# Altium footprint library PcbLib1_newsimcard.PcbLib: 28 footprints (part 1 of 2)
Each footprint in its own frame and in the unit in brackets; x right, y up, seen from the top. Pads: shape width x height; smd on the part's side, far side on the other; paste and mask are expansions set on the pad; w line width, h text height; cw(c..) or ccw(c..) is an arc to the next point about the centre after c.
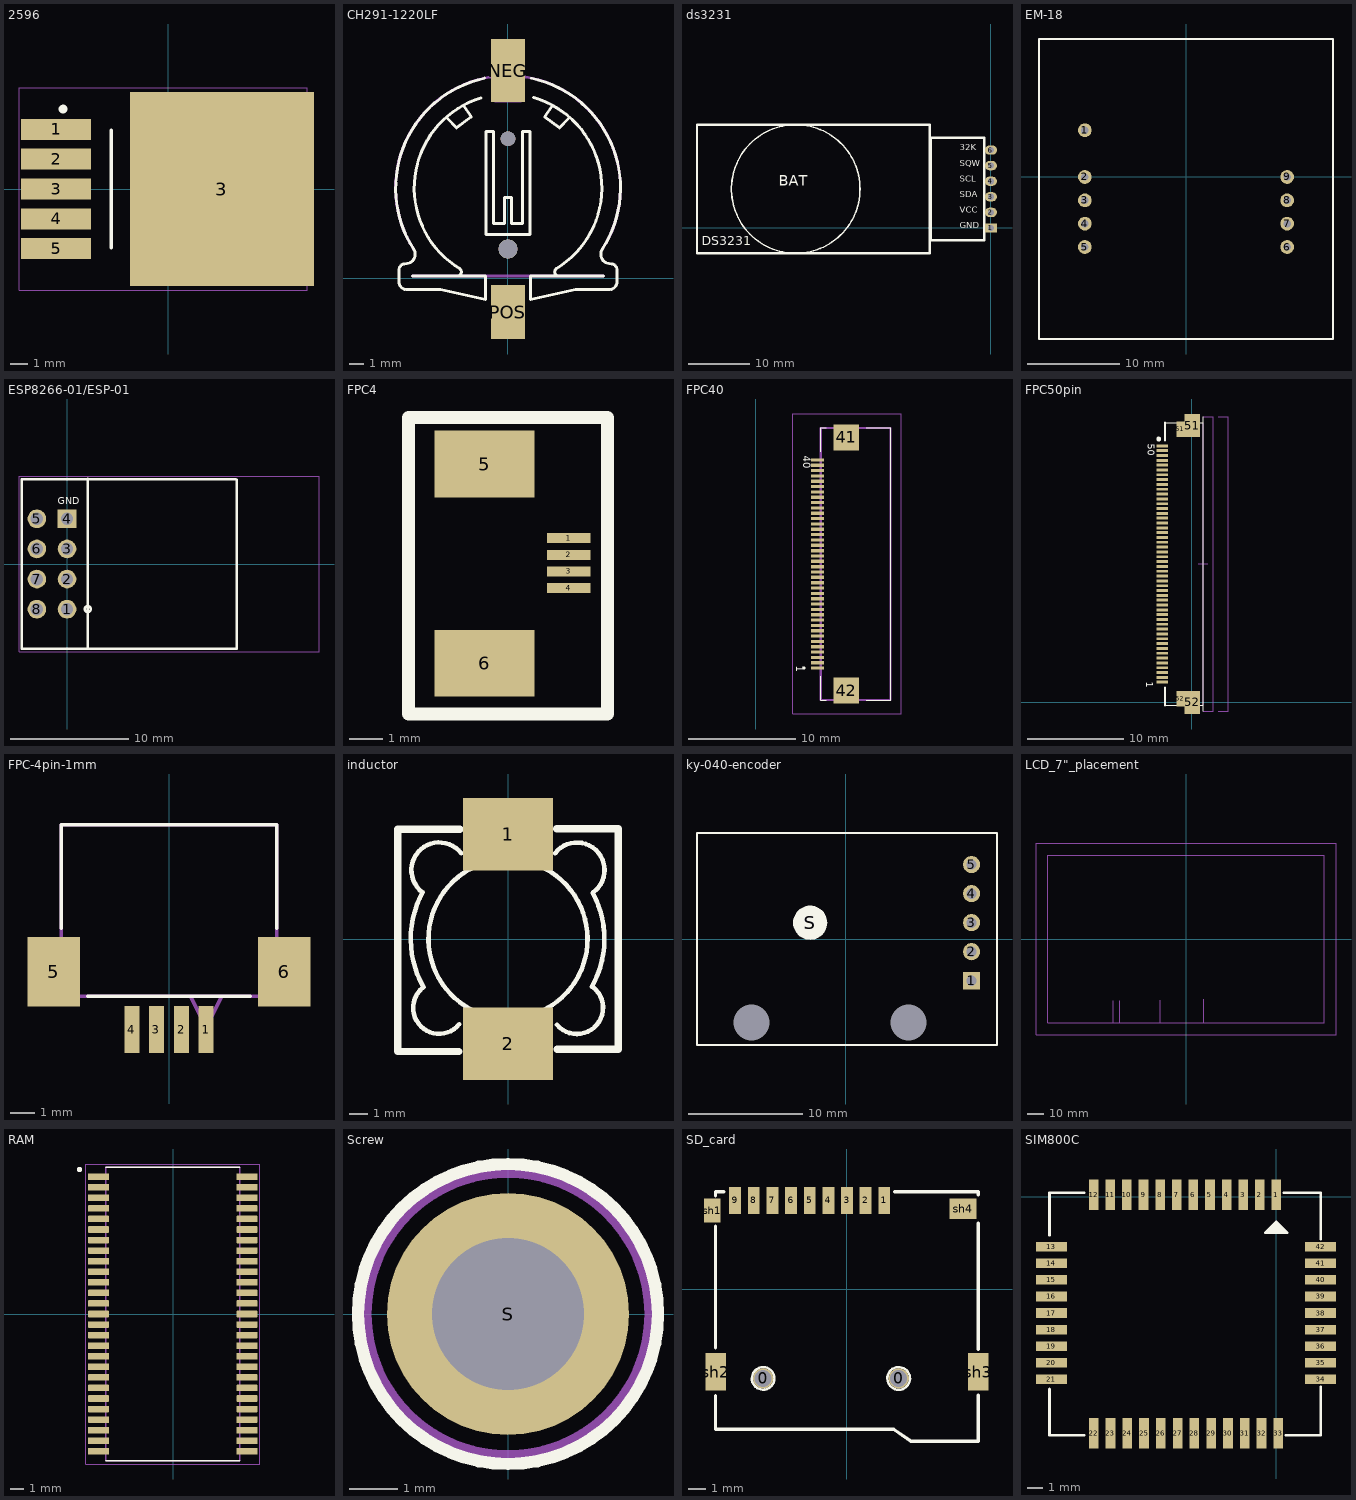
[diagram p0: the footprints below, top view; thin cyan lines are the x and y axes]

## 2596 [mm]
pads (6):
  rect 4x1.2 smd: 1(-6.4,3.4) 2(-6.4,1.7) 3(-6.4,0) 4(-6.4,-1.7) 5(-6.4,-3.4)
  rect 10.5x11.05 smd: 3(3.048,0)
Top Overlay:
  circle w0.25: c-6,4.55 r0.125
  lines w0.2: -3.25,-3.35 -3.25,3.35
Mechanical 13:
  lines w0.1: -2.05,-3.35 -2.05,3.35 4.15,3.35 4.15,-3.35 -2.05,-3.35
Mechanical 15:
  lines w0.05: -8.509,-5.775 -8.509,5.775 7.9,5.775 7.9,-5.775 -8.509,-5.775
  lines w0.1: -0.5,0 0.5,0 ; 0,-0.5 0,0.5
3D body: height 2.38, standoff 0, extent -2.05,-3.35 4.15,3.35

## CH291-1220LF [mm]
pads (4):
  rect 2.3x4.3 smd: NEG(0,14.146)
  rect 2.3x3.66 smd: POS(0,-2.295)
  round 1.3 hole 1.3 unplated: ""(0,2)
  round 1 hole 1 unplated: ""(0,9.5)
Top Overlay:
  lines w0.2: -7.421,0.559 -7.421,-0.239 ccw(c-6.901,-0.239) -6.865,-0.758 ; -7.421,0.561 cw(c-6.993,0.569) -6.985,0.998 ; -6.978,0.997 ccw(c-6.967,1.644) -6.425,1.996 ; -6.863,-0.758 -4.588,-0.758 -1.522,-1.436 -1.522,0.16 -6.5,0.16 ; -6.414,1.979 cw(c0.001,6.145) -1.589,13.627 ; -4.125,10.887 -3.5,10.25 -2.5,11 -3,11.75 ; -3.512,0.162 ccw(c-3.458,0.438) -3.313,0.679 ; -3.274,0.656 cw(c0.029,6.153) -1.846,12.286 ; 1.602,13.624 cw(c0.013,6.151) 6.421,1.99 ; 1.746,12.303 cw(c-0.019,6.148) 3.28,0.659 ; 3,11.75 2.5,11 3.5,10.25 4.125,10.887 ; 3.313,0.679 ccw(c3.457,0.439) 3.501,0.163 ; 6.425,1.996 ccw(c6.967,1.644) 6.978,0.997 ; 6.5,0.16 1.522,0.16 1.522,-1.436 4.588,-0.758 6.863,-0.758 ; 6.865,-0.758 ccw(c6.901,-0.239) 7.421,-0.239 7.421,0.559 ; 6.985,0.998 cw(c6.993,0.569) 7.421,0.561 ; -1.5,3 1.5,3 1.5,10 1,10 1,3.75 0.25,3.75 0.25,5.5 -0.25,5.5 -0.25,3.75 -1,3.75 -1,10 -1.5,10 -1.5,3
Mechanical 13:
  region: 0.9,-3.625 -0.9,-3.625 -0.9,-0.5 0.9,-0.5
  region: 0.9,12 -0.9,12 -0.9,15.825 0.9,15.825
  lines w0.2: -6.5,0.16 6.5,0.16 ; -6.418,1.985 cw(c0,6.153) 6.418,1.985

## ds3231 [mm]
pads (6):
  rect 2x1.5 hole 1: 1(0,0)
  oval 2x1.5 hole 1: 2(0,2.54) 3(0,5.08) 4(0,7.62) 5(0,10.16) 6(0,12.7)
Top Overlay:
  circle w0.254: c-31.877,6.35 r10.5
  lines w0.4: -48,-4.15 -48,16.85 -10,16.85 -10,-4.15 -48,-4.15 ; -9.8,-2 -9.8,14.7 -1.05,14.7 -1.05,-2 -9.8,-2
  text "BAT" at -34.671,6.35 h3
  text "GND" at -5.08,-0.381 h1.7
  text "VCC" at -5.08,2.159 h1.7
  text "SDA" at -5.08,4.699 h1.7
  text "SCL" at -5.08,7.239 h1.7
  text "SQW" at -5.08,9.779 h1.7
  text "32K" at -5.08,12.319 h1.7
  text "DS3231" at -47.244,-3.302 h2.54
3D body "DS3231 RTC (1).SLDPRT": height 14.41, standoff 0.88, extent -47.425,-4.925 -2.675,17.875

## EM-18 [mm]
pads (9):
  round 1.5 hole 0.8 mask+0.05: 1(-11,5.08) 2(-11,0) 3(-11,-2.54) 4(-11,-5.08) 5(-11,-7.62) 6(11,-7.62) 7(11,-5.08) 8(11,-2.54) 9(11,0)
Top Overlay:
  lines w0.2: -16,-17.62 -16,15 16,15 16,-17.62 -16,-17.62

## ESP8266-01/ESP-01 [mm]
pads (8):
  round 1.575 hole 1.05: 1(0,-3.81) 2(0,-1.27) 3(0,1.27) 5(-2.54,3.81) 6(-2.54,1.27) 7(-2.54,-1.27) 8(-2.54,-3.81)
  rect 1.575x1.575 hole 1.05: 4(0,3.81)
Top Overlay:
  circle w0.2: c1.75,-3.8 r0.25
  lines w0.2: 1.75,-7.125 1.75,7.175 ; 14.25,7.15 -3.81,7.15 -3.81,-7.15 14.3,-7.15 ; 14.3,-7.112 14.3,7.112
  text "GND" at -0.762,4.84 h1
Mechanical 15:
  lines w0.05: -4.05,-7.4 -4.05,7.4 21.25,7.4 21.25,-7.4 -4.05,-7.4
3D body "ESP-01S_RevA.STEP": height 10, standoff -1.9, extent -4.025,-7.15 20.575,7.5

## FPC4 [mm]
pads (6):
  rect 1.3x0.3 smd: 1(8.865,26.354) 2(8.865,25.854) 3(8.865,25.354) 4(8.865,24.854)
  rect 3x2 smd: 5(6.35,28.575) 6(6.35,22.606)
Top Overlay:
  lines w0.4: 7.112,29.972 10.033,29.972 10.033,21.082 4.064,21.082 4.064,29.972 7.493,29.972

## FPC40 [mm]
pads (42):
  rect 1.2x0.3 smd: 1(5.771,7.55) 2(5.771,8.05) 3(5.771,8.55) 4(5.771,9.05) 5(5.771,9.55) 6(5.771,10.05) 7(5.771,10.55) 8(5.771,11.05) 9(5.771,11.55) 10(5.771,12.05) 11(5.771,12.55) 12(5.771,13.05) 13(5.771,13.55) 14(5.771,14.05) 15(5.771,14.55) 16(5.771,15.05) 17(5.771,15.55) 18(5.771,16.05) 19(5.771,16.55) 20(5.771,17.05) 21(5.771,17.55) 22(5.771,18.05) 23(5.771,18.55) 24(5.771,19.05) 25(5.771,19.55) 26(5.771,20.05) 27(5.771,20.55) 28(5.771,21.05) 29(5.771,21.55) 30(5.771,22.05) 31(5.771,22.55) 32(5.771,23.05) 33(5.771,23.55) 34(5.771,24.05) 35(5.771,24.55) 36(5.771,25.05) 37(5.771,25.55) 38(5.771,26.05) 39(5.771,26.55) 40(5.771,27.05)
  rect 2.4x2.4 smd: 41(8.471,29.15) 42(8.471,5.45)
Top Overlay:
  lines w0.1: 6.071,4.55 6.596,4.55 6.071,4.55 ; 6.071,4.55 6.071,6.8 6.071,4.55 ; 6.071,30.05 6.071,27.8 6.071,30.05 ; 6.071,30.05 6.596,30.05 6.071,30.05 ; 12.621,4.55 12.621,30.05 ; 12.621,4.55 12.621,30.05 ; 12.621,4.55 10.346,4.55 12.621,4.55 ; 12.621,30.05 10.346,30.05 12.621,30.05
  lines w0.2: 4.446,7.55 cw(c4.496,7.55) 4.546,7.55 ; 4.446,7.55 ccw(c4.496,7.55) 4.546,7.55 ; 4.446,7.55 cw(c4.496,7.55) 4.546,7.55
  text "40" at 4.204,27.432 h1.2
  text "1" at 3.556,7.747 h1.2
Mechanical 13:
  lines w0.2: 6.071,4.55 12.621,4.55 12.621,30.05 6.071,30.05 6.071,4.55
Mechanical 15:
  lines w0.1: 3.446,3.25 13.621,3.25 13.621,31.35 3.446,31.35 3.446,3.25
3D body "54104-4031-TR375.stp": height 2.1, standoff 0, extent 5.201,4.49 12.621,30.11

## FPC50pin [mm]
pads (54):
  rect 1.2x0.3 smd: 1(-3.048,2.098) 2(-3.048,2.598) 3(-3.048,3.098) 4(-3.048,3.598) 5(-3.048,4.098) 6(-3.048,4.598) 7(-3.048,5.098) 8(-3.048,5.598) 9(-3.048,6.098) 10(-3.048,6.598) 11(-3.048,7.098) 12(-3.048,7.598) 13(-3.048,8.098) 14(-3.048,8.598) 15(-3.05,9.098) 16(-3.05,9.598) 17(-3.048,10.098) 18(-3.048,10.598) 19(-3.048,11.098) 20(-3.048,11.598) 21(-3.048,12.098) 22(-3.048,12.598) 23(-3.048,13.098) 24(-3.048,13.598) 25(-3.048,14.098) 26(-3.048,14.598) 27(-3.048,15.098) 28(-3.048,15.598) 29(-3.048,16.098) 30(-3.048,16.598) 31(-3.048,17.098) 32(-3.048,17.598) 33(-3.048,18.098) 34(-3.048,18.598) 35(-3.048,19.098) 36(-3.048,19.598) 37(-3.048,20.098) 38(-3.048,20.598) 39(-3.048,21.098) 40(-3.048,21.598) 41(-3.048,22.098) 42(-3.048,22.598) 43(-3.048,23.098) 44(-3.048,23.598) 45(-3.048,24.098) 46(-3.048,24.598) 47(-3.048,25.098) 48(-3.048,25.598) 49(-3.048,26.098) 50(-3.048,26.598)
  rect 0.8x1.6 smd: 51(-1.148,28.298) 52(-1.148,0.398)
  rect 1.6x2.4 smd: 51(0.052,28.698) 52(0.052,-0.002)
Top Overlay:
  circle w0.25: c-3.398,27.298 r0.125
  lines w0.1: -2.748,-0.302 1.202,-0.302 ; -2.748,28.998 1.202,28.998 ; 1.202,-0.902 1.202,29.598
  lines w0.2: -2.748,-0.302 -2.748,1.548 ; -2.748,27.148 -2.748,28.998
  text "50" at -4.813,26.797 h1.2
  text "1" at -4.953,2.159 h1.2
Bottom Overlay:
  lines w0.2: -2.748,-0.302 -1.948,-0.302 ; -2.748,28.998 -1.948,28.998 ; 1.202,-0.302 1.202,28.998
Bottom Solder:
  lines w0.1: -2.748,-0.302 -2.748,28.998
Mechanical 13:
  lines w0.1: 1.202,-0.902 2.252,-0.902 2.252,29.598 1.202,29.598 ; 1.202,-0.302 1.202,28.998 ; 2.752,-0.902 3.802,-0.902 3.802,29.598 2.752,29.598
Mechanical 15:
  lines w0.1: 0.702,14.348 1.702,14.348 ; 1.202,13.848 1.202,14.848
3D body: height 2, standoff 0, extent -2.747,-0.301 1.201,28.997
3D body: height 2, standoff 0, extent 1.203,-0.901 2.251,29.597

## FPC-4pin-1mm [mil]
pads (6):
  rect 24x75 smd: 1(59,189) 2(20,189) 3(-20,189) 4(-59,189)
  rect 83x110 smd: 5(-183,281) 6(183,281)
Top Overlay:
  lines w6: -171,350 -171,514 171,514 171,350 ; -129,242 129,242
Mechanical 13:
  lines w6: 34,242 59,192 84,242 ; -171,242 171,242 171,514 -171,514 -171,242

## inductor [mm]
pads (2):
  rect 5x4 smd: 1(0,5.8) 2(0,-5.8)
Top Overlay:
  lines w0.254: -4.752,2.599 cw(c-3.81,3.81) -2.595,4.747 ; -4.722,2.582 ccw(c0,0) -4.675,-2.666 ; -4.692,-2.676 ccw(c-3.81,-3.81) -2.688,-4.708 ; -2.463,3.647 ccw(c0,0) -2.422,3.675 ; 2.603,4.749 cw(c3.81,3.81) 4.687,2.557 ; 2.711,-4.752 ccw(c3.81,-3.81) 4.715,-2.679 ; 4.639,-2.636 ccw(c0,0) 4.684,2.555
  lines w0.4: -6.1,6.075 -6.1,-6.225 -2.725,-6.225 ; -6.075,6.075 -2.675,6.075 ; 2.7,6.1 6.1,6.1 6.1,-6.1 2.725,-6.1
3D body "SUMIDA-CDRH127-DEFAULT.STEP": height 7.5, standoff 0.05, extent -6,-6.171 6,6.171

## ky-040-encoder [mm]
pads (8):
  rect 1.5x1.5 hole 0.9: 1(11,-3.65)
  round 1.5 hole 0.9: 2(11,-1.11) 3(11,1.43) 4(11,3.97) 5(11,6.51)
  round 0 hole 3.15: S(-8.25,-7.325) S(5.475,-7.325)
  round 3 on Top Overlay: S(-3.125,1.425)
Top Overlay:
  lines w0.2: -13.025,-9.275 -13.025,9.275 13.225,9.275 13.225,-9.275 -13.025,-9.275
3D body "Encoder KY-040.SLDPRT": height 29.8, standoff 1.99, extent -13.1,-9.3 13.1,9.3

## LCD_7"_placement [mm]
Mechanical 13:
  lines w0.3: -43.5,-50.063 -43.5,-36.788 ; -39.5,-50.063 -39.5,-36.788 ; -15.5,-49.85 -15.5,-36.575 ; 10.5,-49.925 10.5,-35.925 ; -89.5,-57 89.5,-57 89.5,57 -89.5,57 -89.5,-57 ; -82.5,-50 82.5,-50 82.5,50 -82.5,50 -82.5,-50
3D body: height 30, standoff 25, extent -82.5,-50 82.5,50

## RAM [mm]
pads (54):
  rrect25% 1.6x0.5 smd: 1(-5.64,10.4) 2(-5.64,9.6) 3(-5.64,8.8) 4(-5.64,8) 5(-5.64,7.2) 6(-5.64,6.4) 7(-5.64,5.6) 8(-5.64,4.8) 9(-5.64,4) 10(-5.64,3.2) 11(-5.64,2.4) 12(-5.64,1.6) 13(-5.64,0.8) 14(-5.64,0) 15(-5.64,-0.8) 16(-5.64,-1.6) 17(-5.64,-2.4) 18(-5.64,-3.2) 19(-5.64,-4) 20(-5.64,-4.8) 21(-5.64,-5.6) 22(-5.64,-6.4) 23(-5.64,-7.2) 24(-5.64,-8) 25(-5.64,-8.8) 26(-5.64,-9.6) 27(-5.64,-10.4) 28(5.6,-10.4) 29(5.6,-9.6) 30(5.6,-8.8) 31(5.6,-8) 32(5.6,-7.2) 33(5.6,-6.4) 34(5.6,-5.6) 35(5.6,-4.8) 36(5.6,-4) 37(5.6,-3.2) 38(5.6,-2.4) 39(5.6,-1.6) 40(5.6,-0.8) 41(5.6,0) 42(5.6,0.8) 43(5.6,1.6) 44(5.6,2.4) 45(5.6,3.2) 46(5.6,4) 47(5.6,4.8) 48(5.6,5.6) 49(5.6,6.4) 50(5.6,7.2) 51(5.6,8) 52(5.6,8.8) 53(5.6,9.6) 54(5.6,10.4)
Top Overlay:
  circle w0.2: c-7.08,10.94 r0.1
  lines w0.127: -5.1,-11.11 5.06,-11.11 ; -5.1,11.11 5.06,11.11
Mechanical 13:
  circle w0.2: c-7.08,10.94 r0.1
  lines w0.127: -5.1,-11.11 5.06,-11.11 5.06,11.11 -5.1,11.11 -5.1,-11.11
Mechanical 15:
  lines w0.05: -6.61,-11.36 6.57,-11.36 6.57,11.36 -6.61,11.36 -6.61,-11.36

## Screw [mm]
pads (1):
  round 5 hole 3.15 mask+0.1: S(0,0)
Top Overlay:
  circle w0.254: c0,0 r3.099
Mechanical 15:
  circle w0.254: c0,0 r2.942

## SD_card [mm]
pads (15):
  round 1.2 hole 1: 0(-4.95,-5.25) 0(3.05,-5.25)
  rect 0.7x1.6 smd: 1(2.2,5.25) 2(1.1,5.25) 3(0,5.25) 4(-1.1,5.25) 5(-2.2,5.25) 6(-3.3,5.25) 7(-4.4,5.25) 8(-5.5,5.25) 9(-6.6,5.25)
  rect 1x1.4 smd: sh1(-7.95,4.65)
  rect 1.2x2.2 smd: sh2(-7.75,-4.85) sh3(7.75,-4.85)
  rect 1.6x1.2 smd: sh4(6.85,4.75)
Top Overlay:
  lines w0.15: -4.297,-5.141 ccw(c-4.95,-5.25) -4.295,-5.151 ; 3.714,-5.187 ccw(c3.05,-5.25) 3.717,-5.261
  lines w0.2: -7.76,-6.26 -7.76,-8.25 2.75,-8.25 3.76,-8.95 7.74,-8.95 7.74,-6.25 ; -7.76,-3.45 -7.76,3.72 ; -7.76,5.52 -7.76,5.77 -7.28,5.77 ; 2.82,5.77 7.74,5.77 7.74,5.59 ; 7.74,-3.53 7.74,3.9
3D body: height 1, standoff 0.5, extent -7.785,-8.98 7.74,5.815

## SIM800C [mil]
pads (42):
  rect 25x80 smd: 1(0,5) 2(-43.18,5) 3(-86.36,5) 4(-129.55,5) 5(-172.73,5) 6(-215.91,5) 7(-259.09,5) 8(-302.27,5) 9(-345.45,5) 10(-388.64,5) 11(-431.82,5) 12(-475,5) 22(-475,-615) 23(-431.36,-615) 24(-387.73,-615) 25(-344.09,-615) 26(-300.45,-615) 27(-256.82,-615) 28(-213.18,-615) 29(-169.55,-615) 30(-125.91,-615) 31(-82.27,-615) 32(-38.64,-615) 33(5,-615)
  rect 80x25 smd: 13(-585,-130) 14(-585,-173.12) 15(-585,-216.25) 16(-585,-259.38) 17(-585,-302.5) 18(-585,-345.62) 19(-585,-388.75) 20(-585,-431.88) 21(-585,-475) 34(115,-475) 35(115,-431.88) 36(115,-388.75) 37(115,-345.62) 38(115,-302.5) 39(115,-259.38) 40(115,-216.25) 41(115,-173.12) 42(115,-130)
Top Overlay:
  lines w5: -27,-91 27,-91 ; -24,-88 24,-88 ; -21,-85 21,-85 ; -18,-82 18,-82 ; -15,-79 15,-79 ; -12,-76 12,-76 ; -9,-73 9,-73 ; -6,-70 6,-70 ; -3,-67 3,-67 ; -30,-94 29,-94 0,-64 -30,-94
  lines w7: -590,-500 -590,-620 -500,-620 ; -590,-100 -590,10 -500,10 ; 20,10 115,10 115,-110 ; 25,-620 115,-620 115,-495
3D body "SIM800C-1.STEP": height 87.85, standoff -4.27, extent -582.92,-613.11 110,5